# Altium schematic symbol library SparkFun.SCHLIB: 796 symbols (part 2 of 5) (continued)
## FT232RL-BASICSSOP (continued)
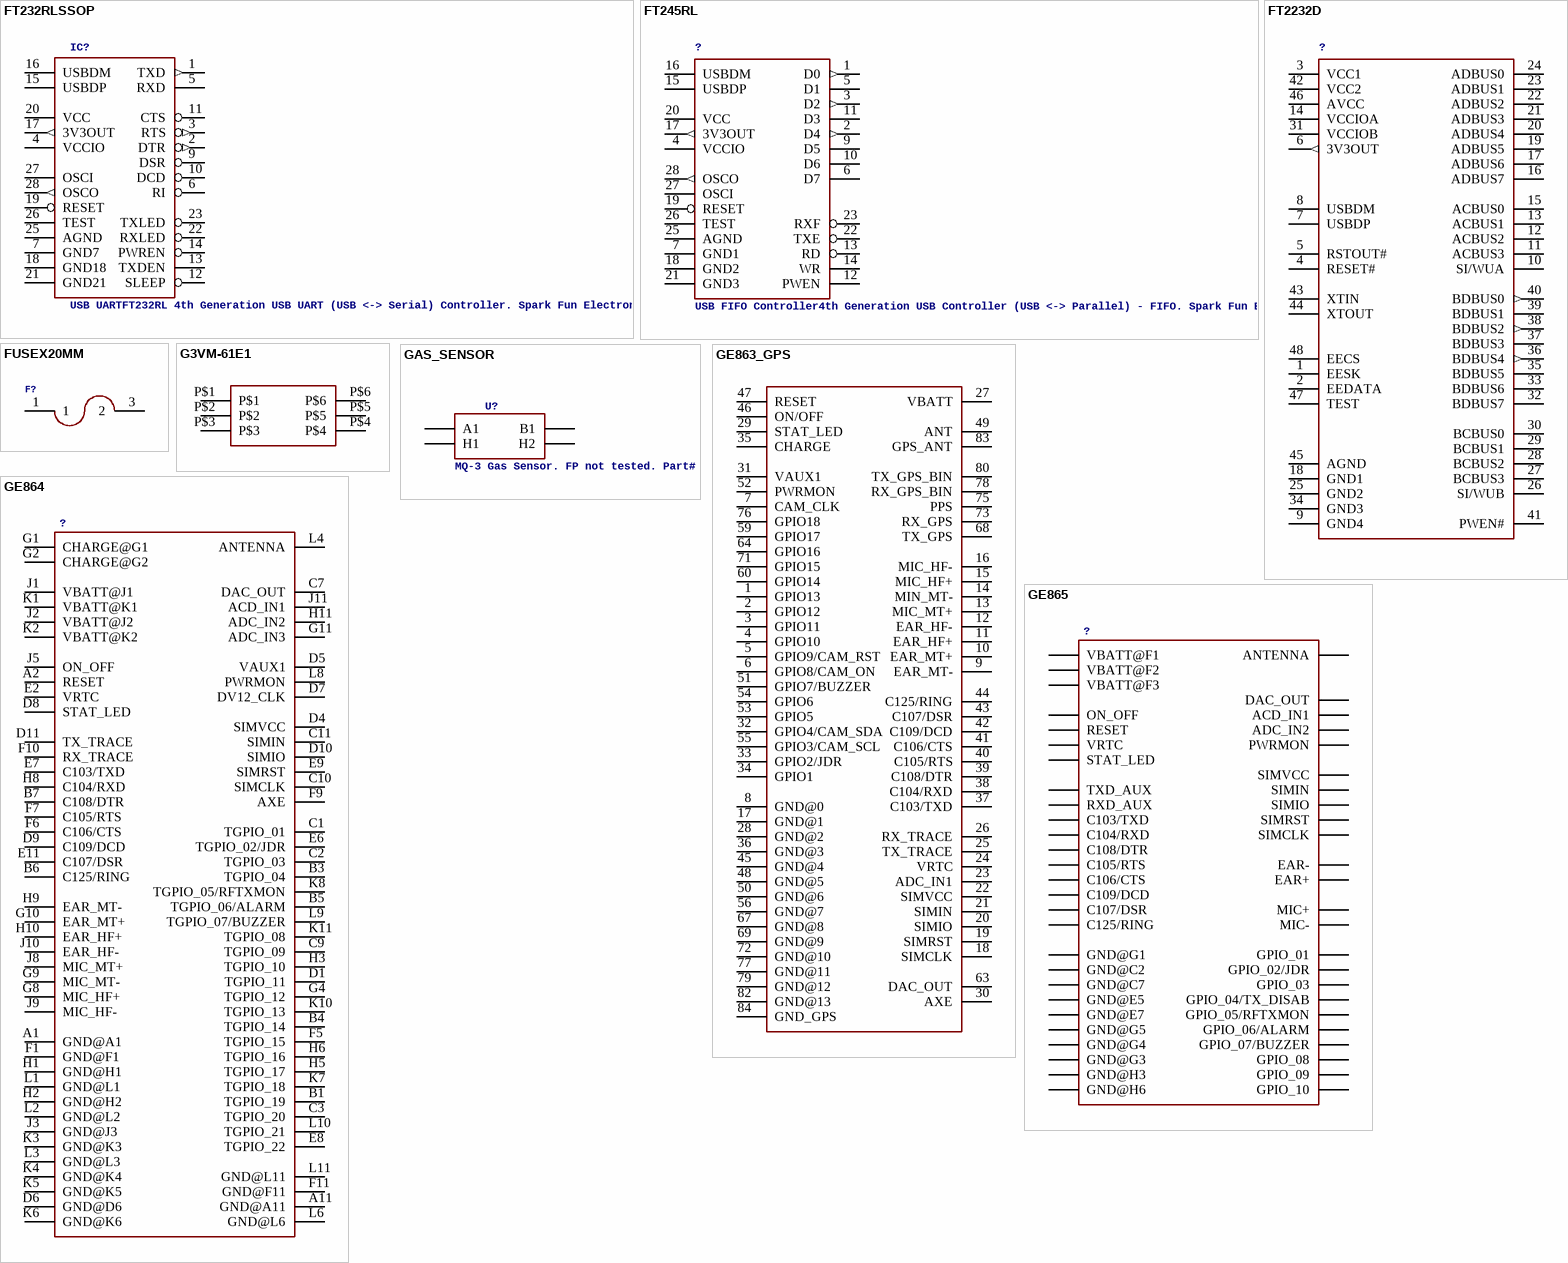
[diagram p15: symbols FT232RLSSOP to GE865]

## FT232RLSSOP
designator IC?, comment USB UARTFT232RL 4th Generation USB UART (USB <-> Serial) Controller. Spark Fun Electronics SKU : COM-00650
footprint SSOP28DB
pins: 1 TXD (out), 2 DTR (out), 3 RTS (out), 4 VCCIO (power), 5 RXD, 6 RI, 7 GND7 (power), 9 DSR, 10 DCD, 11 CTS, 12 SLEEP, 13 TXDEN, 14 PWREN, 15 USBDP, 16 USBDM, 17 3V3OUT (out), 18 GND18 (power), 19 RESET, 20 VCC (power), 21 GND21 (power), 22 RXLED, 23 TXLED, 25 AGND (power), 26 TEST, 27 OSCI, 28 OSCO (out)

## FT245RL
designator ?, comment USB FIFO Controller4th Generation USB Controller (USB <-> Parallel) - FIFO. Spark Fun Electronics SKU : COM-00787
footprint SSOP28DB
pins: 1 D0 (out), 2 D4 (out), 3 D2 (out), 4 VCCIO (power), 5 D1, 6 D7, 7 GND1 (power), 9 D5, 10 D6, 11 D3, 12 PWEN, 13 RD, 14 WR, 15 USBDP, 16 USBDM, 17 3V3OUT (out), 18 GND2 (power), 19 RESET, 20 VCC (power), 21 GND3 (power), 22 TXE, 23 RXF, 25 AGND (power), 26 TEST, 27 OSCI, 28 OSCO (out)

## FT2232D
designator ?
footprint LQFP-48
pins: 1 EESK, 2 EEDATA, 3 VCC1 (power), 4 RESET#, 5 RSTOUT#, 6 3V3OUT (out), 7 USBDP, 8 USBDM, 9 GND4, 10 SI/WUA, 11 ACBUS3, 12 ACBUS2, 13 ACBUS1, 14 VCCIOA (power), 15 ACBUS0, 16 ADBUS7, 17 ADBUS6, 18 GND1 (power), 19 ADBUS5, 20 ADBUS4, 21 ADBUS3, 22 ADBUS2, 23 ADBUS1, 24 ADBUS0, 25 GND2 (power), 26 SI/WUB, 27 BCBUS3, 28 BCBUS2, 29 BCBUS1, 30 BCBUS0, 31 VCCIOB, 32 BDBUS7, 33 BDBUS6, 34 GND3 (power), 35 BDBUS5, 36 BDBUS4 (out), 37 BDBUS3, 38 BDBUS2 (out), 39 BDBUS1, 40 BDBUS0 (out), 41 PWEN#, 42 VCC2 (power), 43 XTIN, 44 XTOUT, 45 AGND (power), 46 AVCC, 47 TEST, 48 EECS

## FUSEX20MM
designator F?
footprint FUSE_5MM
pins: 1, 3 2

## G3VM-61E1
designator ?
footprint G3VM-61E1
pins: P$1, P$2, P$3, P$4, P$5, P$6

## GAS_SENSOR
designator U?, comment MQ-3 Gas Sensor. FP not tested. Part#
footprint MQ-3
pins: A1, B1, HA H1, HB H2

## GE863_GPS
designator ?, comment GE863 Cellular Module with GPSProto layout and schematic for GE863 cellular module with SiRF III GPS. Spark Fun Electronics SKU : CEL-08246  (value not drawn)
footprint GE863
pins: 1 GPIO13, 2 GPIO12, 3 GPIO11, 4 GPIO10, 5 GPIO9/CAM_RST, 6 GPIO8/CAM_ON, 7 CAM_CLK, 8 GND@0, 9 EAR_MT-, 10 EAR_MT+, 11 EAR_HF+, 12 EAR_HF-, 13 MIC_MT+, 14 MIN_MT-, 15 MIC_HF+, 16 MIC_HF-, 17 GND@1, 18 SIMCLK, 19 SIMRST, 20 SIMIO, 21 SIMIN, 22 SIMVCC, 23 ADC_IN1, 24 VRTC, 25 TX_TRACE, 26 RX_TRACE, 27 VBATT, 28 GND@2, 29 STAT_LED, 30 AXE, 31 VAUX1, 32 GPIO4/CAM_SDA, 33 GPIO2/JDR, 34 GPIO1, 35 CHARGE, 36 GND@3, 37 C103/TXD, 38 C104/RXD, 39 C108/DTR, 40 C105/RTS, 41 C106/CTS, 42 C109/DCD, 43 C107/DSR, 44 C125/RING, 45 GND@4, 46 ON/OFF, 47 RESET, 48 GND@5, 49 ANT, 50 GND@6, 51 GPIO7/BUZZER, 52 PWRMON, 53 GPIO5, 54 GPIO6, 55 GPIO3/CAM_SCL, 56 GND@7, 59 GPIO17, 60 GPIO14, 63 DAC_OUT, 64 GPIO16, 67 GND@8, 68 TX_GPS, 69 GND@9, 71 GPIO15, 72 GND@10, 73 RX_GPS, 75 PPS, 76 GPIO18, 77 GND@11, 78 RX_GPS_BIN, 79 GND@12, 80 TX_GPS_BIN, 82 GND@13, 83 GPS_ANT, 84 GND_GPS

## GE864
designator ?
footprint GE864
pins: A1 GND@A1, A2 RESET, A11 GND@A11, B1 TGPIO_19, B3 TGPIO_04, B4 TGPIO_14, B5 TGPIO_06/ALARM, B6 C125/RING, B7 C108/DTR, C1 TGPIO_01, C2 TGPIO_03, C3 TGPIO_20, C7 DAC_OUT, C9 TGPIO_09, C10 SIMCLK, C11 SIMIN, D1 TGPIO_11, D4 SIMVCC, D5 VAUX1, D6 GND@D6, D7 DV12_CLK, D8 STAT_LED, D9 C109/DCD, D10 SIMIO, D11 TX_TRACE, E2 VRTC, E6 TGPIO_02/JDR, E7 C103/TXD, E8 TGPIO_22, E9 SIMRST, E11 C107/DSR, F1 GND@F1, F5 TGPIO_15, F6 C106/CTS, F7 C105/RTS, F9 AXE, F10 RX_TRACE, F11 GND@F11, G1 CHARGE@G1, G2 CHARGE@G2, G4 TGPIO_12, G8 MIC_HF+, G9 MIC_MT-, G10 EAR_MT+, G11 ADC_IN3, H1 GND@H1, H2 GND@H2, H3 TGPIO_10, H5 TGPIO_17, H6 TGPIO_16, H8 C104/RXD, H9 EAR_MT-, H10 EAR_HF+, H11 ADC_IN2, J1 VBATT@J1, J2 VBATT@J2, J3 GND@J3, J5 ON_OFF, J8 MIC_MT+, J9 MIC_HF-, J10 EAR_HF-, J11 ACD_IN1, K1 VBATT@K1, K2 VBATT@K2, K3 GND@K3, K4 GND@K4, K5 GND@K5, K6 GND@K6, K7 TGPIO_18, K8 TGPIO_05/RFTXMON, K10 TGPIO_13, K11 TGPIO_08, L1 GND@L1, L2 GND@L2, L3 GND@L3, L4 ANTENNA, L6 GND@L6, L8 PWRMON, L9 TGPIO_07/BUZZER, L10 TGPIO_21, L11 GND@L11

## GE865
designator ?
footprint GE865
pins: A1 C105/RTS, A2 C106/CTS, A3 C103/TXD, A4 C104/RXD, A5 SIMCLK, A6 SIMIO, A7 SIMVCC, A8 SIMRST, B1 ON_OFF, B2 C107/DSR, B3 C108/DTR, B4 C125/RING, B5 C109/DCD, B7 SIMIN, B8 MIC+, C1 RESET, C2 GND@C2, C7 GND@C7, C8 MIC-, D1 TXD_AUX, D2 GPIO_02/JDR, D3 GPIO_01, D4 GPIO_08, D8 EAR+, E1 RXD_AUX, E2 PWRMON, E3 GPIO_10, E4 GPIO_03, E5 GND@E5, E7 GND@E7, E8 EAR-, F1 VBATT@F1, F2 VBATT@F2, F3 VBATT@F3, F4 GPIO_09, F5 ACD_IN1, F6 ADC_IN2, G1 GND@G1, G2 GPIO_05/RFTXMON, G3 GND@G3, G4 GND@G4, G5 GND@G5, G6 GPIO_07/BUZZER, G7 DAC_OUT, G8 STAT_LED, H2 VRTC, H3 GND@H3, H5 ANTENNA, H6 GND@H6, H7 GPIO_04/TX_DISAB, H8 GPIO_06/ALARM

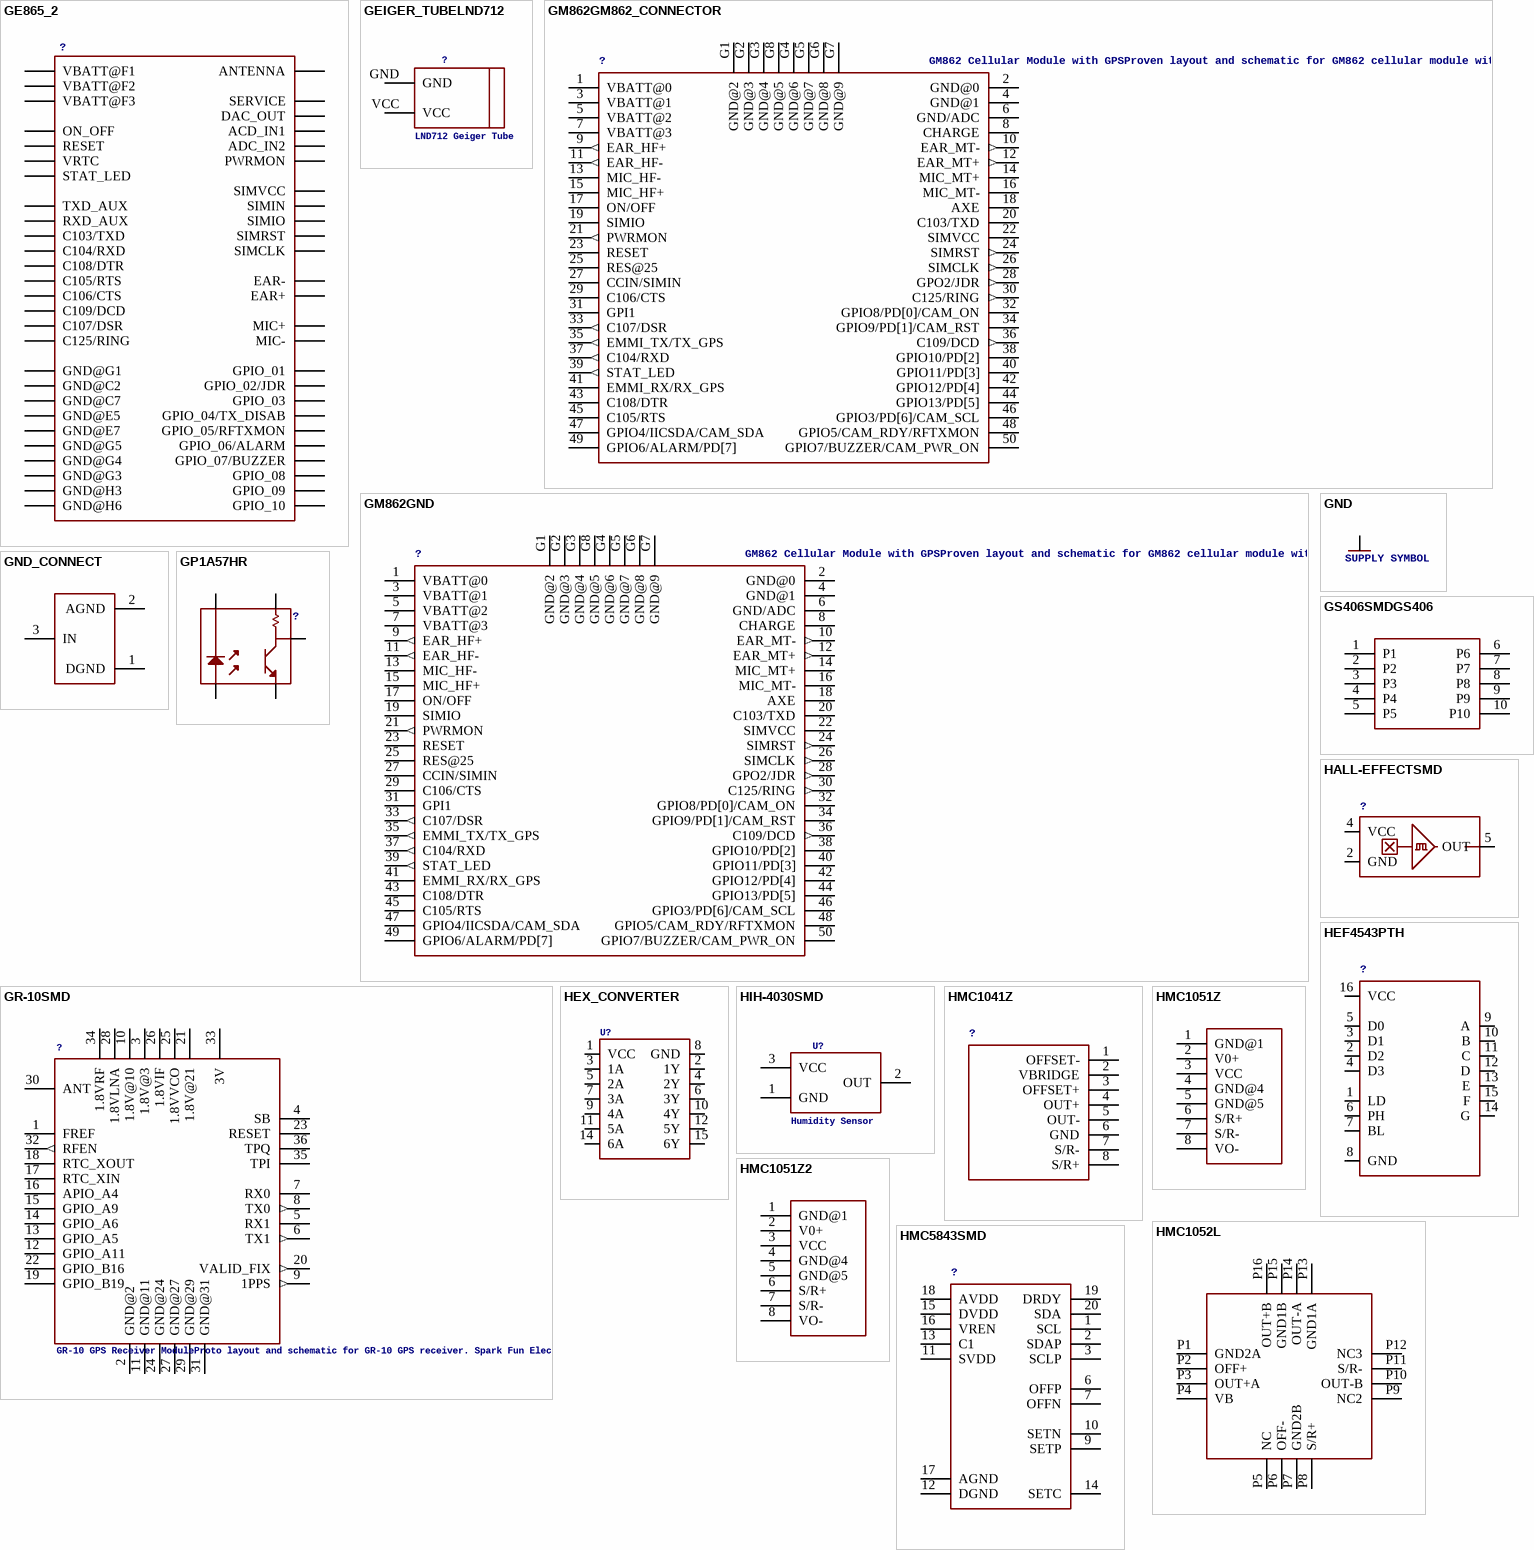
[diagram p16: symbols GE865_2 to HMC5843SMD]

## GE865_2
designator ?
footprint GE865
pins: A1 C105/RTS, A2 C106/CTS, A3 C103/TXD, A4 C104/RXD, A5 SIMCLK, A6 SIMIO, A7 SIMVCC, A8 SIMRST, B1 ON_OFF, B2 C107/DSR, B3 C108/DTR, B4 C125/RING, B5 C109/DCD, B7 SIMIN, B8 MIC+, C1 RESET, C2 GND@C2, C7 GND@C7, C8 MIC-, D1 TXD_AUX, D2 GPIO_02/JDR, D3 GPIO_01, D4 GPIO_08, D8 EAR+, E1 RXD_AUX, E2 PWRMON, E3 GPIO_10, E4 GPIO_03, E5 GND@E5, E7 GND@E7, E8 EAR-, F1 VBATT@F1, F2 VBATT@F2, F3 VBATT@F3, F4 GPIO_09, F5 ACD_IN1, F6 ADC_IN2, G1 GND@G1, G2 GPIO_05/RFTXMON, G3 GND@G3, G4 GND@G4, G5 GND@G5, G6 GPIO_07/BUZZER, G7 DAC_OUT, G8 STAT_LED, H1 SERVICE, H2 VRTC, H3 GND@H3, H5 ANTENNA, H6 GND@H6, H7 GPIO_04/TX_DISAB, H8 GPIO_06/ALARM

## GEIGER_TUBELND712
designator ?, comment LND712 Geiger Tube
footprint GEIGER_TUBE
pins: GND, VCC

## GM862GM862_CONNECTOR
designator ?, comment GM862 Cellular Module with GPSProven layout and schematic for GM862 cellular module with SiRF III GPS. Spark Fun Electronics SKU : CEL-07917
footprint GM862_CONNECTOR
pins: 1 VBATT@0 (power), 2 GND@0 (power), 3 VBATT@1 (power), 4 GND@1 (power), 5 VBATT@2 (power), 6 GND/ADC (power), 7 VBATT@3 (power), 8 CHARGE, 9 EAR_HF+ (out), 10 EAR_MT- (out), 11 EAR_HF- (out), 12 EAR_MT+ (out), 13 MIC_HF-, 14 MIC_MT+, 15 MIC_HF+, 16 MIC_MT-, 17 ON/OFF, 18 AXE, 19 SIMIO, 20 C103/TXD, 21 PWRMON (out), 22 SIMVCC (power), 23 RESET, 24 SIMRST (out), 25 RES@25, 26 SIMCLK (out), 27 CCIN/SIMIN, 28 GPO2/JDR (out), 29 C106/CTS, 30 C125/RING (out), 31 GPI1, 32 GPIO8/PD[0]/CAM_ON, 33 C107/DSR (out), 34 GPIO9/PD[1]/CAM_RST, 35 EMMI_TX/TX_GPS (out), 36 C109/DCD (out), 37 C104/RXD (out), 38 GPIO10/PD[2], 39 STAT_LED (out), 40 GPIO11/PD[3], 41 EMMI_RX/RX_GPS, 42 GPIO12/PD[4], 43 C108/DTR, 44 GPIO13/PD[5], 45 C105/RTS, 46 GPIO3/PD[6]/CAM_SCL, 47 GPIO4/IICSDA/CAM_SDA, 48 GPIO5/CAM_RDY/RFTXMON, 49 GPIO6/ALARM/PD[7], 50 GPIO7/BUZZER/CAM_PWR_ON, G1 GND@2 (power), G2 GND@3 (power), G3 GND@4 (power), G4 GND@6 (power), G5 GND@7 (power), G6 GND@8 (power), G7 GND@9 (power), G8 GND@5 (power)

## GM862GND
designator ?, comment GM862 Cellular Module with GPSProven layout and schematic for GM862 cellular module with SiRF III GPS. Spark Fun Electronics SKU : CEL-07917
footprint GM862
pins: 1 VBATT@0 (power), 2 GND@0 (power), 3 VBATT@1 (power), 4 GND@1 (power), 5 VBATT@2 (power), 6 GND/ADC (power), 7 VBATT@3 (power), 8 CHARGE, 9 EAR_HF+ (out), 10 EAR_MT- (out), 11 EAR_HF- (out), 12 EAR_MT+ (out), 13 MIC_HF-, 14 MIC_MT+, 15 MIC_HF+, 16 MIC_MT-, 17 ON/OFF, 18 AXE, 19 SIMIO, 20 C103/TXD, 21 PWRMON (out), 22 SIMVCC (power), 23 RESET, 24 SIMRST (out), 25 RES@25, 26 SIMCLK (out), 27 CCIN/SIMIN, 28 GPO2/JDR (out), 29 C106/CTS, 30 C125/RING (out), 31 GPI1, 32 GPIO8/PD[0]/CAM_ON, 33 C107/DSR (out), 34 GPIO9/PD[1]/CAM_RST, 35 EMMI_TX/TX_GPS (out), 36 C109/DCD (out), 37 C104/RXD (out), 38 GPIO10/PD[2], 39 STAT_LED (out), 40 GPIO11/PD[3], 41 EMMI_RX/RX_GPS, 42 GPIO12/PD[4], 43 C108/DTR, 44 GPIO13/PD[5], 45 C105/RTS, 46 GPIO3/PD[6]/CAM_SCL, 47 GPIO4/IICSDA/CAM_SDA, 48 GPIO5/CAM_RDY/RFTXMON, 49 GPIO6/ALARM/PD[7], 50 GPIO7/BUZZER/CAM_PWR_ON, G1 GND@2 (power), G2 GND@3 (power), G3 GND@4 (power), G4 GND@6 (power), G5 GND@7 (power), G6 GND@8 (power), G7 GND@9 (power), G8 GND@5 (power)

## GND
designator GND?, comment SUPPLY SYMBOL
pins: ?1 GND (oe)

## GND_CONNECT
designator ?
footprint GND_CONNECT
pins: 1 DGND, 2 AGND, 3 IN

## GP1A57HR
designator ?
footprint GP1A57HR
pins: 1, 2, 3, 4, 5

## GR-10SMD
designator ?, comment GR-10 GPS Receiver ModuleProto layout and schematic for GR-10 GPS receiver. Spark Fun Electronics SKU : GPS-08291
footprint GR-10
pins: 1 FREF, 2 GND@2 (power), 3 1.8V@3 (power), 4 SB, 5 RX1, 6 TX1 (out), 7 RX0, 8 TX0 (out), 9 1PPS (out), 10 1.8V@10 (power), 11 GND@11 (power), 12 GPIO_A11, 13 GPIO_A5, 14 GPIO_A6, 15 GPIO_A9, 16 APIO_A4, 17 RTC_XIN, 18 RTC_XOUT, 19 GPIO_B19, 20 VALID_FIX (out), 21 1.8V@21 (power), 22 GPIO_B16, 23 RESET, 24 GND@24 (power), 25 1.8VVCO (power), 26 1.8VIF (power), 27 GND@27 (power), 28 1.8VLNA (power), 29 GND@29 (power), 30 ANT, 31 GND@31 (power), 32 RFEN (out), 33 3V (power), 34 1.8VRF (power), 35 TPI, 36 TPQ

## GS406SMDGS406
designator ?, comment 50 Channel GS406 Helical GPS Receiver - SMD Connector sku: GPS-09079  (value not drawn)
footprint GS406SMD
pins: 1 P1, 2 P2, 3 P3, 4 P4, 5 P5, 6 P6, 7 P7, 8 P8, 9 P9, 10 P10

## HALL-EFFECTSMD
designator ?
footprint SC70
pins: 2 GND, 4 VCC, 5 OUT

## HEF4543PTH
designator ?
footprint DIL16
pins: 1 LD, 2 D2, 3 D1, 4 D3, 5 D0, 6 PH, 7 BL, 8 GND, 9 A, 10 B, 11 C, 12 D, 13 E, 14 G, 15 F, 16 VCC

## HEX_CONVERTER
designator U?
footprint SO016
pins: 1 VCC, 2 1Y, 3 1A, 4 2Y, 5 2A, 6 3Y, 7 3A, 8 GND, 9 4A, 10 4Y, 11 5A, 12 5Y, 14 6A, 15 6Y

## HIH-4030SMD
designator U?, comment Humidity Sensor
footprint HIH-4030
pins: 1 GND, 2 OUT, 3 VCC

## HMC1041Z
designator ?
footprint HMC1041Z
pins: 1 OFFSET-, 2 VBRIDGE, 3 OFFSET+, 4 OUT+, 5 OUT-, 6 GND, 7 S/R-, 8 S/R+

## HMC1051Z
designator ?
footprint HMC1051Z3
pins: 1 GND@1, 2 V0+, 3 VCC, 4 GND@4, 5 GND@5, 6 S/R+, 7 S/R-, 8 VO-

## HMC1051Z2
designator ?
footprint HMC1051Z_2
pins: 1 GND@1, 2 V0+, 3 VCC, 4 GND@4, 5 GND@5, 6 S/R+, 7 S/R-, 8 VO-

## HMC1052L
designator ?, comment HMC1052LDual axis magnetic sensor. Used for compass and magnetometer applications. Schematic and footprint are not tested and probably need fixing. Spark Fun Electronics SKU : COM-00708  (value not drawn)
footprint 16LPCC
pins: P1 GND2A, P2 OFF+, P3 OUT+A, P4 VB, P5 NC, P6 OFF-, P7 GND2B, P8 S/R+, P9 NC2, P10 OUT-B, P11 S/R-, P12 NC3, P13 GND1A, P14 OUT-A, P15 GND1B, P16 OUT+B

## HMC5843SMD
designator ?
footprint LPCC20
pins: 1 SCL, 2 SDAP, 3 SCLP, 6 OFFP, 7 OFFN, 9 SETP, 10 SETN, 11 SVDD, 12 DGND, 13 C1, 14 SETC, 15 DVDD, 16 VREN, 17 AGND, 18 AVDD, 19 DRDY, 20 SDA

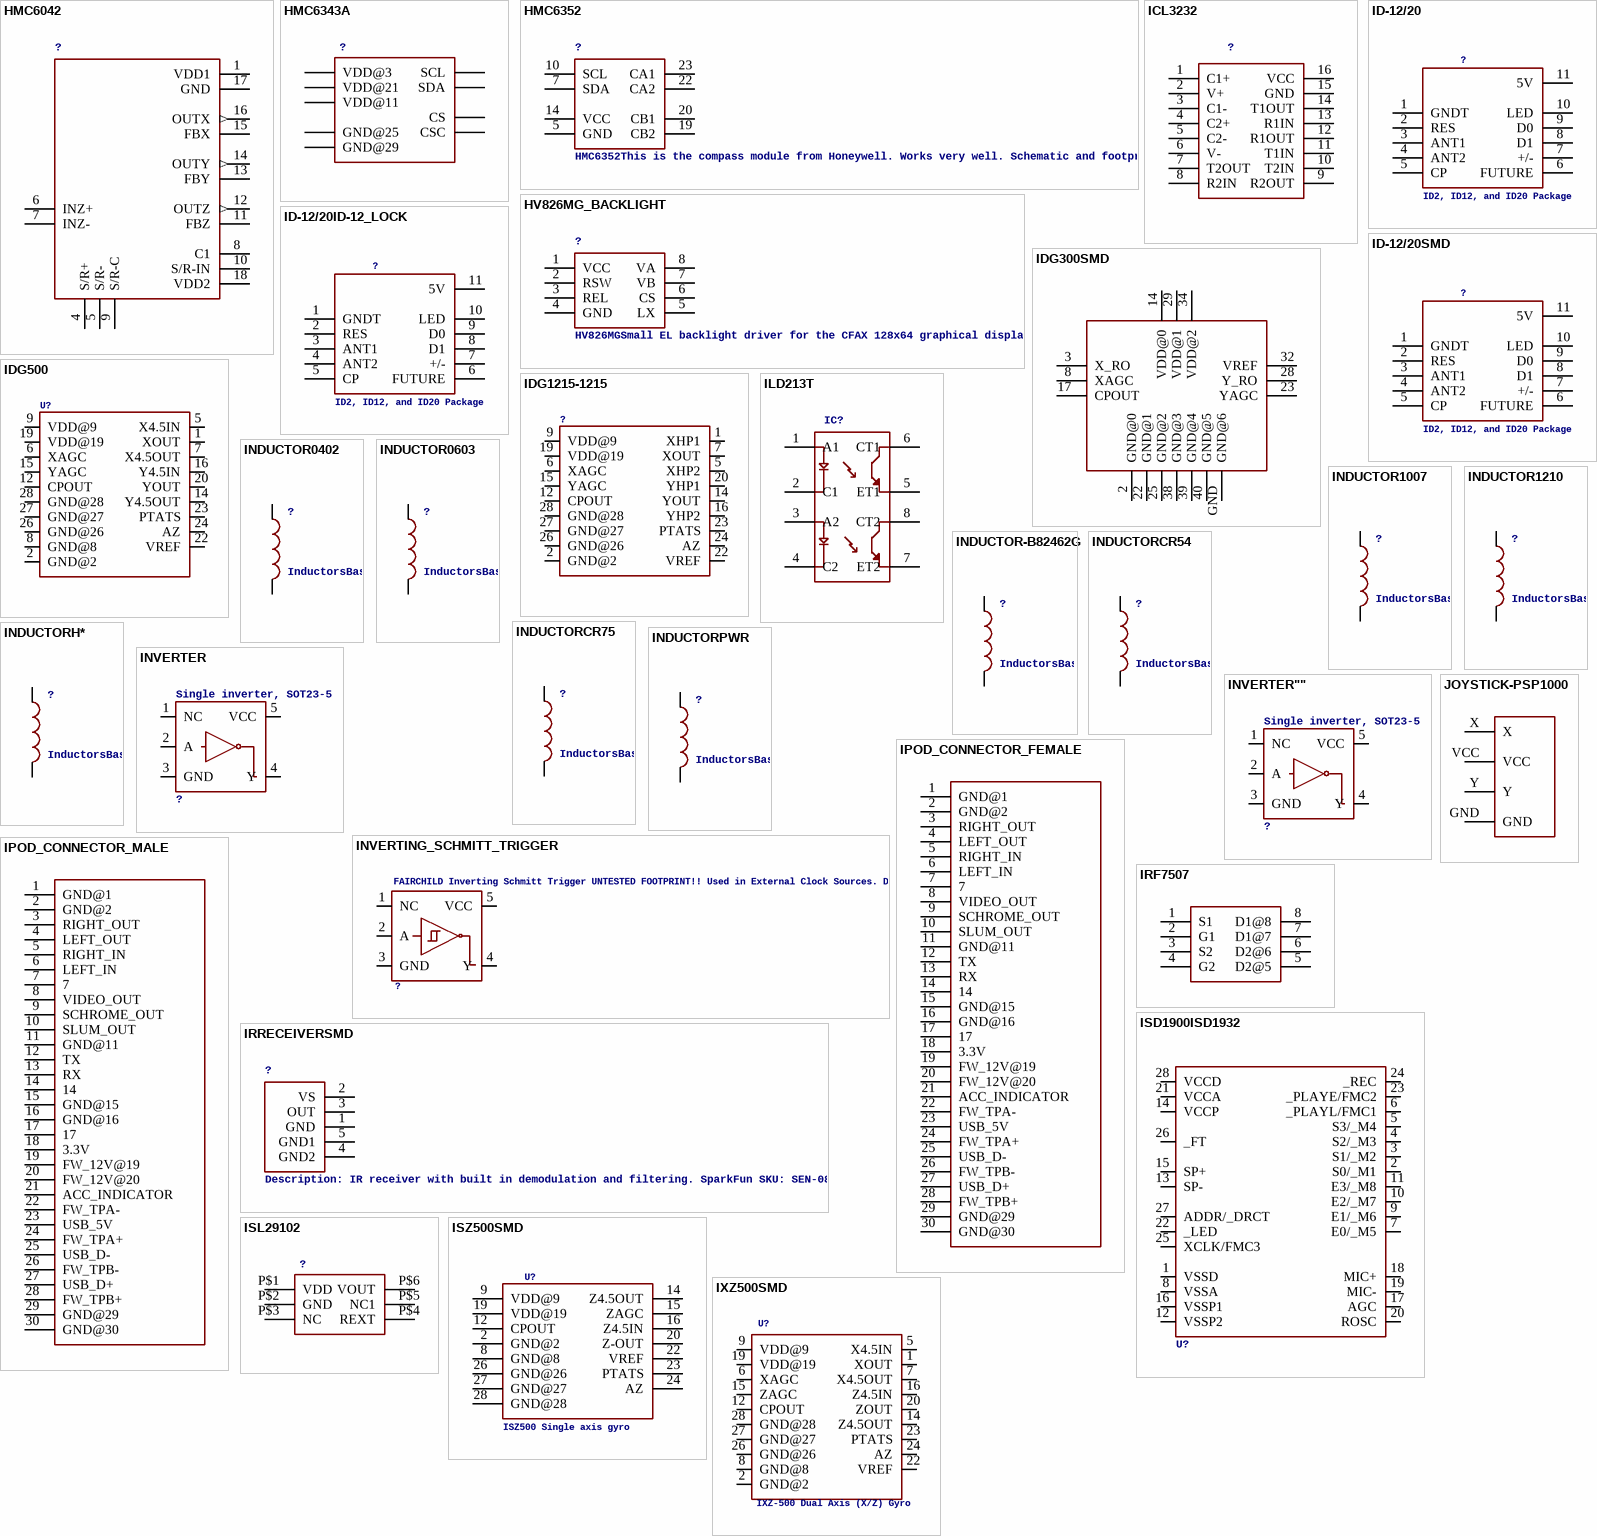
[diagram p17: symbols HMC6042 to JOYSTICK-PSP1000]

## HMC6042
designator ?
footprint HMC6042
pins: 1 VDD1, 4 S/R+, 5 S/R-, 6 INZ+, 7 INZ-, 8 C1, 9 S/R-C, 10 S/R-IN, 11 FBZ, 12 OUTZ (out), 13 FBY, 14 OUTY (out), 15 FBX, 16 OUTX (out), 17 GND, 18 VDD2

## HMC6343A
designator ?
footprint LCC36
pins: 3 VDD@3, 11 VDD@11, 21 VDD@21, 22 CS, 25 GND@25, 29 GND@29, 32 SCL, 35 CSC, 36 SDA

## HMC6352
designator ?, comment HMC6352This is the compass module from Honeywell. Works very well. Schematic and footprint are production proven. Spark Fun Electronics SKU : COM-07892
footprint LCC24
pins: 5 GND, 7 SDA, 10 SCL, 14 VCC, 19 CB2, 20 CB1, 22 CA2, 23 CA1

## HV826MG_BACKLIGHT
designator ?, comment HV826MGSmall EL backlight driver for the CFAX 128x64 graphical display.
footprint MSOP8
pins: 1 VCC, 2 RSW, 3 REL (power), 4 GND (power), 5 LX, 6 CS, 7 VB, 8 VA

## ICL3232
designator ?
footprint DIL16
pins: 1 C1+, 2 V+, 3 C1-, 4 C2+, 5 C2-, 6 V-, 7 T2OUT, 8 R2IN, 9 R2OUT, 10 T2IN, 11 T1IN, 12 R1OUT, 13 R1IN, 14 T1OUT, 15 GND, 16 VCC

## ID-12/20
designator ?, comment ID2, ID12, and ID20 Package
footprint ID-12
pins: 1 GNDT, 2 RES, 3 ANT1, 4 ANT2, 5 CP, 6 FUTURE, 7 +/-, 8 D1, 9 D0, 10 LED, 11 5V

## ID-12/20ID-12_LOCK
designator ?, comment ID2, ID12, and ID20 Package
footprint ID-12_LOCK
pins: 1 GNDT, 2 RES, 3 ANT1, 4 ANT2, 5 CP, 6 FUTURE, 7 +/-, 8 D1, 9 D0, 10 LED, 11 5V

## ID-12/20SMD
designator ?, comment ID2, ID12, and ID20 Package
footprint ID-12_SMD
pins: 1 GNDT, 2 RES, 3 ANT1, 4 ANT2, 5 CP, 6 FUTURE, 7 +/-, 8 D1, 9 D0, 10 LED, 11 5V

## IDG300SMD
designator ?, comment IDG300This is a dual axis MEMs based gyroscope sensor from Invensense. The only gyro in currently available with two axis on one chip. Works very well. Schematic and footprint are not yet production proven. Spark Fun Electronics SKU : COM-00700  (value not drawn)
footprint IDG300
pins: 2 GND@0, 3 X_RO, 8 XAGC, 14 VDD@0, 17 CPOUT, 22 GND@1, 23 YAGC, 25 GND@2, 28 Y_RO, 29 VDD@1, 32 VREF, 34 VDD@2, 38 GND@3, 39 GND@4, 40 GND@5, GND GND@6

## IDG500
designator U?
footprint SPARKFUN_IDG500
pins: 1 XOUT, 2 GND@2, 5 X4.5IN, 6 XAGC, 7 X4.5OUT, 8 GND@8, 9 VDD@9, 12 CPOUT, 14 Y4.5OUT, 15 YAGC, 16 Y4.5IN, 19 VDD@19, 20 YOUT, 22 VREF, 23 PTATS, 24 AZ, 26 GND@26, 27 GND@27, 28 GND@28

## IDG1215-1215
designator ?
footprint IDG500
pins: 1 XHP1, 2 GND@2, 5 XHP2, 6 XAGC, 7 XOUT, 9 VDD@9, 12 CPOUT, 14 YOUT, 15 YAGC, 16 YHP2, 19 VDD@19, 20 YHP1, 22 VREF, 23 PTATS, 24 AZ, 26 GND@26, 27 GND@27, 28 GND@28

## ILD213T
designator IC?
footprint SO08
pins: 1 A1, 2 C1, 3 A2, 4 C2, 5 ET1, 6 CT1, 7 ET2, 8 CT2

## INDUCTOR0402
designator ?, comment InductorsBasic Inductor/Choke - 0603 and 1206. Footprints are not proven and vary greatly between part numbers.
footprint C0402
pins: 1, 2

## INDUCTOR0603
designator ?, comment InductorsBasic Inductor/Choke - 0603 and 1206. Footprints are not proven and vary greatly between part numbers.
footprint 0603
pins: 1, 2

## INDUCTOR1007
designator ?, comment InductorsBasic Inductor/Choke - 0603 and 1206. Footprints are not proven and vary greatly between part numbers.
footprint 1007
pins: 1, 2

## INDUCTOR1210
designator ?, comment InductorsBasic Inductor/Choke - 0603 and 1206. Footprints are not proven and vary greatly between part numbers.
footprint 1210
pins: 1, 2

## INDUCTOR-B82462G
designator ?, comment InductorsBasic Inductor/Choke - 0603 and 1206. Footprints are not proven and vary greatly between part numbers.
footprint B82462G
pins: P$1 1, P$2 2

## INDUCTORCR54
designator ?, comment InductorsBasic Inductor/Choke - 0603 and 1206. Footprints are not proven and vary greatly between part numbers.
footprint CR54
pins: P$1 1, P$2 2

## INDUCTORCR75
designator ?, comment InductorsBasic Inductor/Choke - 0603 and 1206. Footprints are not proven and vary greatly between part numbers.
footprint CR75
pins: P$1 1, P$2 2

## INDUCTORH*
designator ?, comment InductorsBasic Inductor/Choke - 0603 and 1206. Footprints are not proven and vary greatly between part numbers.
footprint INDUCTOR-1206
pins: P$1 1, P$2 2

## INDUCTORPWR
designator ?, comment InductorsBasic Inductor/Choke - 0603 and 1206. Footprints are not proven and vary greatly between part numbers.
footprint CDRH125
pins: 1, 2

## INVERTER
designator ?, comment Single inverter, SOT23-5
footprint SOT23-5
pins: 1 NC, 2 A, 3 GND, 4 Y, 5 VCC

## INVERTER""
designator ?, comment Single inverter, SOT23-5
footprint SC70
pins: 1 NC, 2 A, 3 GND, 4 Y, 5 VCC

## INVERTING_SCHMITT_TRIGGER
designator ?, comment FAIRCHILD Inverting Schmitt Trigger UNTESTED FOOTPRINT!! Used in External Clock Sources. Digikey P/N NC7SZ14M5XCT-ND
footprint TSSOP5
pins: 1 NC, 2 A, 3 GND, 4 Y, 5 VCC

## IPOD_CONNECTOR_FEMALE
designator ?, comment iPod Female ConnectorThis is the connector found inside current iPods. Use this connector to attach to iPod accessories like Nike+iPods, etc. Schematic and footprint are not yet production proven. Spark Fun Electronics SKU : DEV-08035  (value not drawn)
footprint IPOD_FEMALE_CONNECTOR
pins: 1 GND@1, 2 GND@2, 3 RIGHT_OUT, 4 LEFT_OUT, 5 RIGHT_IN, 6 LEFT_IN, 7, 8 VIDEO_OUT, 9 SCHROME_OUT, 10 SLUM_OUT, 11 GND@11, 12 TX, 13 RX, 14, 15 GND@15, 16 GND@16, 17, 18 3.3V, 19 FW_12V@19, 20 FW_12V@20, 21 ACC_INDICATOR, 22 FW_TPA-, 23 USB_5V, 24 FW_TPA+, 25 USB_D-, 26 FW_TPB-, 27 USB_D+, 28 FW_TPB+, 29 GND@29, 30 GND@30

## IPOD_CONNECTOR_MALE
designator ?, comment iPod Male ConnectorThis is the connector that will insert into an iPods. Use this connector to gain access to the various iPod pins. Schematic and footprint are not yet production proven. The PCB thickness must be more thin than the standard 0.062" FR4. Spark Fun Electronics SKU : DEV-00633  (value not drawn)
footprint IPOD_MALE_CONNECTOR
pins: 1 GND@1, 2 GND@2, 3 RIGHT_OUT, 4 LEFT_OUT, 5 RIGHT_IN, 6 LEFT_IN, 7, 8 VIDEO_OUT, 9 SCHROME_OUT, 10 SLUM_OUT, 11 GND@11, 12 TX, 13 RX, 14, 15 GND@15, 16 GND@16, 17, 18 3.3V, 19 FW_12V@19, 20 FW_12V@20, 21 ACC_INDICATOR, 22 FW_TPA-, 23 USB_5V, 24 FW_TPA+, 25 USB_D-, 26 FW_TPB-, 27 USB_D+, 28 FW_TPB+, 29 GND@29, 30 GND@30

## IRF7507
designator ?
footprint MSOP8
pins: 1 S1, 2 G1, 3 S2, 4 G2, 5 D2@5, 6 D2@6, 7 D1@7, 8 D1@8

## IRRECEIVERSMD
designator ?, comment Description: IR receiver with built in demodulation and filtering. SparkFun SKU: SEN-08545
footprint TSOP8523
pins: 1 GND, 2 VS, 3 OUT, 4 GND2, 5 GND1

## ISD1900ISD1932
designator U?
footprint SO-28W
pins: 1 VSSD, 2 S0/_M1, 3 S1/_M2, 4 S2/_M3, 5 S3/_M4, 6 _PLAYL/FMC1, 7 E0/_M5, 8 VSSA, 9 E1/_M6, 10 E2/_M7, 11 E3/_M8, 12 VSSP2, 13 SP-, 14 VCCP, 15 SP+, 16 VSSP1, 17 AGC, 18 MIC+, 19 MIC-, 20 ROSC, 21 VCCA, 22 _LED, 23 _PLAYE/FMC2, 24 _REC, 25 XCLK/FMC3, 26 _FT, 27 ADDR/_DRCT, 28 VCCD

## ISL29102
designator ?
footprint ODFN6
pins: P$1 VDD, P$2 GND, P$3 NC, P$4 REXT, P$5 NC1, P$6 VOUT

## ISZ500SMD
designator U?, comment ISZ500 Single axis gyro
footprint QFN-28_6X8
pins: 2 GND@2, 8 GND@8, 9 VDD@9, 12 CPOUT, 14 Z4.5OUT, 15 ZAGC, 16 Z4.5IN, 19 VDD@19, 20 Z-OUT, 22 VREF, 23 PTATS, 24 AZ, 26 GND@26, 27 GND@27, 28 GND@28

## IXZ500SMD
designator U?, comment IXZ-500 Dual Axis (X/Z) Gyro
footprint QFN-28_6X8
pins: 1 XOUT, 2 GND@2, 5 X4.5IN, 6 XAGC, 7 X4.5OUT, 8 GND@8, 9 VDD@9, 12 CPOUT, 14 Z4.5OUT, 15 ZAGC, 16 Z4.5IN, 19 VDD@19, 20 ZOUT, 22 VREF, 23 PTATS, 24 AZ, 26 GND@26, 27 GND@27, 28 GND@28

## JOYSTICK-PSP1000
designator ?, comment This is a footprint for the PSP-1000 Joystick.  4-pins: X, Y, Vcc and GND  (value not drawn)
footprint JOYSTICK-PSP1000
pins: GND, VCC, X, Y
